# Altium footprint library EDR.PcbLib: 85 footprints (part 5 of 6)
Each footprint in its own frame and in the unit in brackets; x right, y up, seen from the top. Pads: shape width x height; smd on the part's side, far side on the other; paste and mask are expansions set on the pad; w line width, h text height; cw(c..) or ccw(c..) is an arc to the next point about the centre after c.
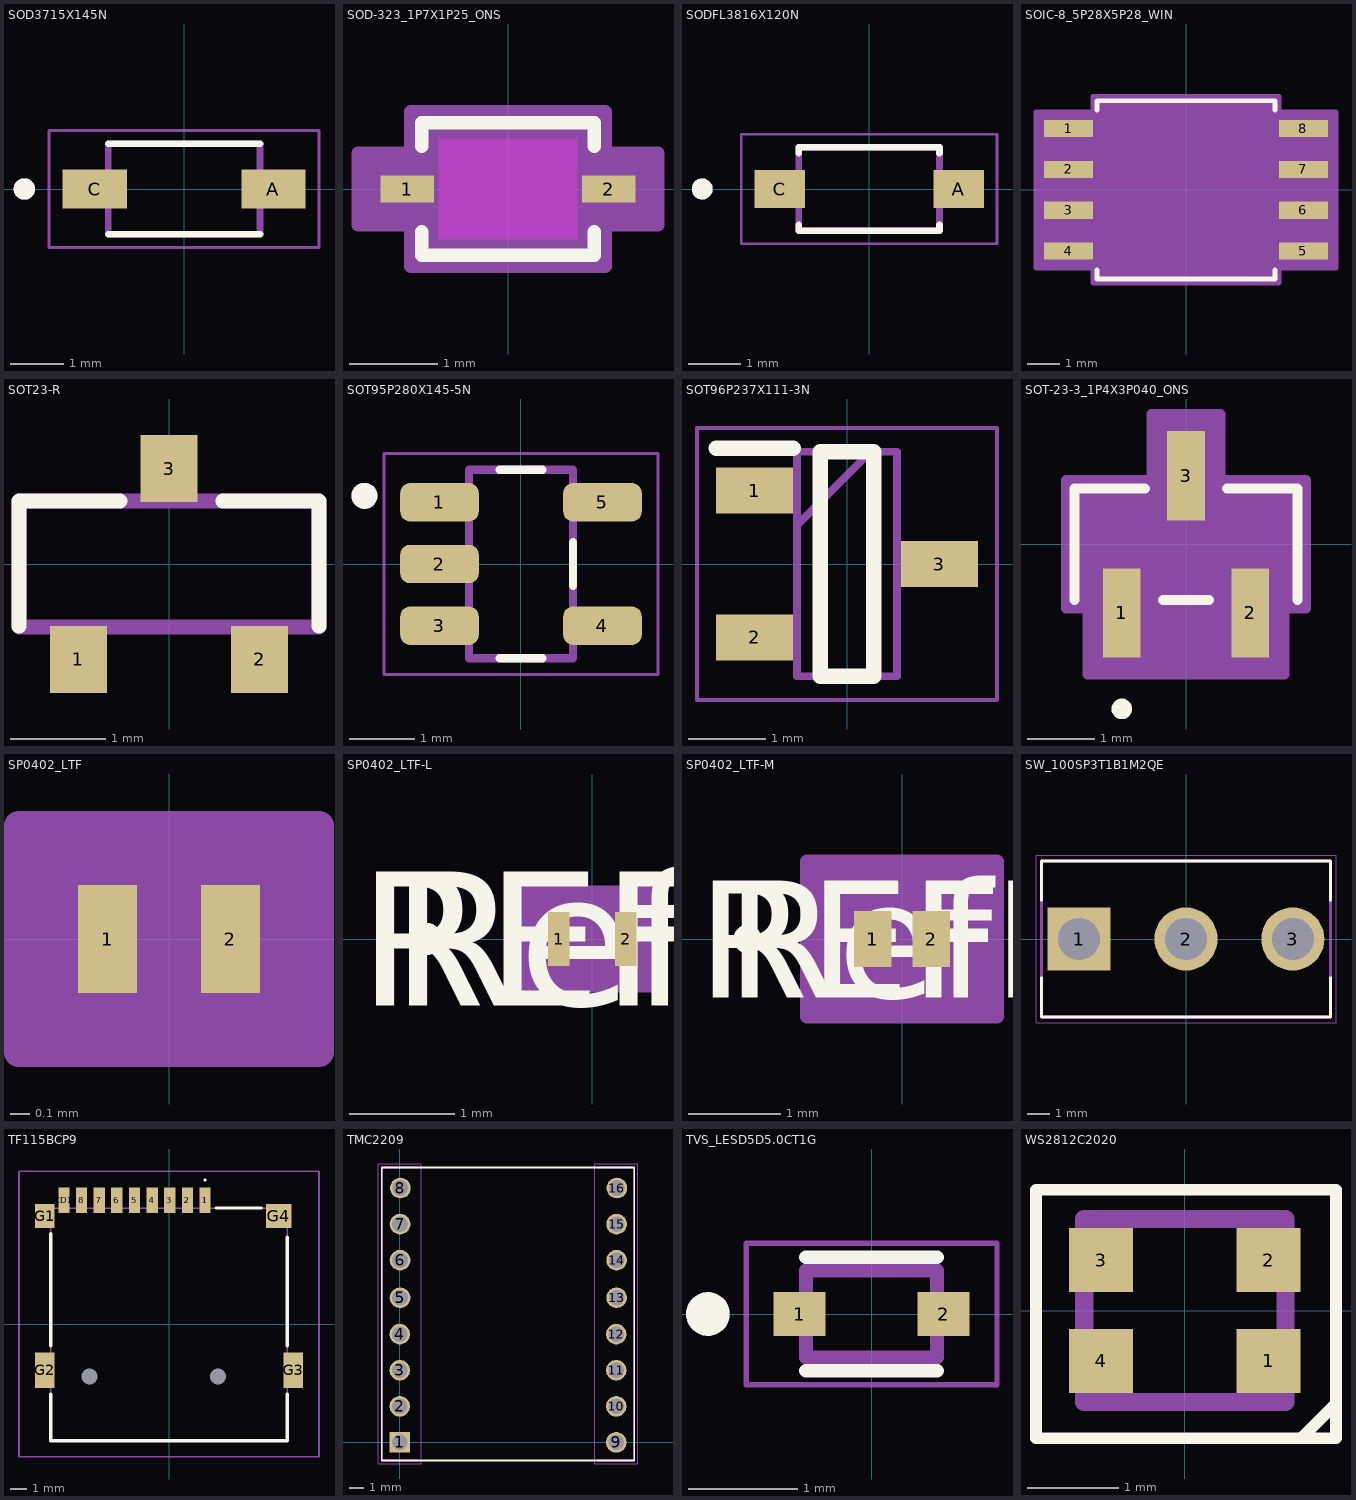
[diagram p4: the footprints below, top view; thin cyan lines are the x and y axes]

## SOD3715X145N [mm]
pads (2):
  rect 1.21x0.73 smd: A(1.68,0) C(-1.68,0)
Top Overlay:
  circle w0.2: c-3,0 r0.1
  lines w0.127: -1.425,-0.85 1.425,-0.85 ; -1.425,0.85 1.425,0.85
Top 3D Body:
  circle w0.2: c-3,0 r0.1
  lines w0.127: -1.425,-0.85 -1.425,0.85 1.425,0.85 1.425,-0.85 -1.425,-0.85
Top Courtyard:
  lines w0.05: -2.535,-1.1 -2.535,1.1 2.535,1.1 2.535,-1.1 -2.535,-1.1
3D body "step_temp.STEP": height 0.8, standoff -0.73, extent -1.825,-0.775 1.825,0.775

## SOD-323_1P7X1P25_ONS [mil]
pads (2):
  rect 24x12 smd paste+0 mask+0: 1(-45,0) 2(45,0)
Top Layer keep-out:
  region: -31,-22.5 -31,22.5 31,22.5 31,-22.5
Top Overlay:
  lines w6: -38.5,-19.1 -38.5,-29.5 38.5,-29.5 38.5,-19.1 ; -38.5,19.1 -38.5,29.5 38.5,29.5 38.5,19.1
Keep-Out Layer:
  region: -31,-22.5 -31,22.5 31,22.5 31,-22.5
Top 3D Body:
  lines w1: -33.5,-12.25 -21.25,-24.5 ; -33.5,12.25 -21.25,24.5 ; -49,-6 -49,6 -33.5,6 -33.5,-6 -49,-6 ; -33.5,-24.5 33.5,-24.5 33.5,24.5 -33.5,24.5 -33.5,-24.5 ; 33.5,-6 33.5,6 49,6 49,-6 33.5,-6
  text "*" at -36,-25 h50
Top Courtyard:
  region: -43.5,-16 -67,-16 -67,16 -43.5,16 -43.5,34.5 43.5,34.5 43.5,16 67,16 67,-16 43.5,-16 43.5,-34.5 -43.5,-34.5
  lines w6: -67,-16 -67,16 -43.5,16 -43.5,34.5 43.5,34.5 43.5,16 67,16 67,-16 43.5,-16 43.5,-34.5 -43.5,-34.5 -43.5,-16 -67,-16
3D body "SOD-323_1P7X1P25_ONS.step": height 18.27, standoff 0, extent -49.02,-24.49 49.02,24.49

## SODFL3816X120N [mm]
height 1.2
pads (2):
  rect 0.97x0.73 smd paste+0 mask+0.102: A(1.72,0) C(-1.72,0)
Top Overlay:
  circle w0.2: c-3.205,0 r0.1
  lines w0.127: -1.35,-0.685 -1.35,-0.8 1.35,-0.8 1.35,-0.685 ; -1.35,0.685 -1.35,0.8 1.35,0.8 1.35,0.685
Top 3D Body:
  circle w0.2: c-3.205,0 r0.1
  lines w0.127: -1.35,-0.8 1.35,-0.8 1.35,0.8 -1.35,0.8 -1.35,-0.8
Top Courtyard:
  lines w0.05: -2.455,-1.05 2.455,-1.05 2.455,1.05 -2.455,1.05 -2.455,-1.05
3D body "step_temp.STEP": height 1.1, standoff 0.1, extent -1.9,-0.762 1.9,0.838

## SOIC-8_5P28X5P28_WIN [mil]
pads (8):
  rect 60x21 smd paste+0 mask+0: 1(-143.5,75) 2(-143.5,25) 3(-143.5,-25) 4(-143.5,-75) 5(143.5,-75) 6(143.5,-25) 7(143.5,25) 8(143.5,75)
Top Overlay:
  lines w6: -109,-97.8 -109,-109 109,-109 109,-97.8 ; -109,97.8 -109,109 109,109 109,97.8
Top 3D Body:
  lines w1: -12,104 ccw(c0,104) 12,104 ; -159.5,-84.5 -104,-84.5 -104,-65.5 -159.5,-65.5 -159.5,-84.5 ; -159.5,-34.5 -104,-34.5 -104,-15.5 -159.5,-15.5 -159.5,-34.5 ; -159.5,15.5 -104,15.5 -104,34.5 -159.5,34.5 -159.5,15.5 ; -159.5,65.5 -104,65.5 -104,84.5 -159.5,84.5 -159.5,65.5 ; -104,-104 -104,104 104,104 104,-104 -104,-104 ; 104,-84.5 159.5,-84.5 159.5,-65.5 104,-65.5 104,-84.5 ; 104,-34.5 159.5,-34.5 159.5,-15.5 104,-15.5 104,-34.5 ; 104,15.5 159.5,15.5 159.5,34.5 104,34.5 104,15.5 ; 104,65.5 159.5,65.5 159.5,84.5 104,84.5 104,65.5
  text "*" at -101.5,51 h50
Top Courtyard:
  region: -114,-95.5 -183.5,-95.5 -183.5,95.5 -114,95.5 -114,114 114,114 114,95.5 183.5,95.5 183.5,-95.5 114,-95.5 114,-114 -114,-114
  lines w6: -183.5,-95.5 -114,-95.5 -114,-114 114,-114 114,-95.5 183.5,-95.5 183.5,95.5 114,95.5 114,114 -114,114 -114,95.5 -183.5,95.5 -183.5,-95.5
3D body "SOIC-8_5P28X5P28_WIN.step": height 85.12, standoff 0, extent -159.49,-104.02 159.49,104.02

## SOT23-R [mm]
pads (3):
  rect 0.6x0.7 smd paste+0 mask+0.102: 1(-0.95,-1) 2(0.95,-1) 3(0,1)
Top Overlay:
  lines w0.152: -1.572,-0.652 -1.572,0.66 -0.514,0.66 ; 0.564,0.66 1.572,0.66 1.572,-0.652
Top 3D Body:
  region: -0.711,-1.297 -1.17,-1.297 -1.17,-0.711 -0.711,-0.711
  region: 1.168,-1.296 0.711,-1.296 0.711,-0.711 1.168,-0.711
  region: 0.229,0.711 -0.229,0.711 -0.229,1.295 0.229,1.295
  lines w0.152: -1.572,-0.66 -1.572,0.66 1.572,0.66 1.572,-0.66 -1.572,-0.66
3D body "step_temp.STEP": height 1.2, standoff -0.1, extent -1.516,-1.3 1.524,1.3

## SOT95P280X145-5N [mm]
pads (5):
  rrect50% 1.21x0.59 smd: 1(-1.255,0.95) 2(-1.255,0) 3(-1.255,-0.95) 4(1.255,-0.95) 5(1.255,0.95)
Top Overlay:
  circle w0.2: c-2.41,1.05 r0.1
  lines w0.127: -0.33,-1.45 0.33,-1.45 ; -0.33,1.45 0.33,1.45 ; 0.8,-0.335 0.8,0.335
Top 3D Body:
  circle w0.2: c-2.41,1.05 r0.1
  lines w0.127: -0.8,-1.45 0.8,-1.45 0.8,1.45 -0.8,1.45 -0.8,-1.45
Top Courtyard:
  lines w0.05: -2.11,-1.7 -2.11,1.7 2.11,1.7 2.11,-1.7 -2.11,-1.7
3D body "step_temp.STEP": height 1.45, standoff 0, extent -1.4,-1.45 1.4,1.45

## SOT96P237X111-3N [mm]
pads (3):
  rect 1x0.6 smd: 1(-1.2,0.955) 2(-1.2,-0.955) 3(1.2,0)
Top Overlay:
  lines w0.2: -1.7,1.505 -0.7,1.505 ; -0.35,-1.46 -0.35,1.46 0.35,1.46 0.35,-1.46 -0.35,-1.46
Top Courtyard:
  lines w0.1: -0.65,0.505 0.305,1.46 ; -0.65,-1.46 -0.65,1.46 0.65,1.46 0.65,-1.46 -0.65,-1.46
Bottom Assembly:
  lines w0.05: -1.95,-1.77 -1.95,1.77 1.95,1.77 1.95,-1.77 -1.95,-1.77

## SOT-23-3_1P4X3P040_ONS [mil]
pads (3):
  rect 22x52 smd paste+0 mask+0: 1(-37.5,-40) 2(37.5,-40) 3(0,40)
Top Overlay:
  circle w6: c-37.5,-96 r3
  lines w6: -65,-32.5 -65,32.5 -24.1,32.5 ; -13.4,-32.5 13.4,-32.5 ; 24.1,32.5 65,32.5 65,-32.5
Top 3D Body:
  circle w0: c-37.5,-17.5 r3
  lines w1: -60,-27.5 60,-27.5 60,27.5 -60,27.5 -60,-27.5 ; -47.5,-52 -47.5,-27.5 -27.5,-27.5 -27.5,-52 -47.5,-52 ; -10,27.5 10,27.5 10,52 -10,52 -10,27.5 ; 27.5,-52 27.5,-27.5 47.5,-27.5 47.5,-52 27.5,-52
Top Courtyard:
  region: -70,-37.5 -70,37.5 -20,37.5 -20,76 20,76 20,37.5 70,37.5 70,-37.5 57.5,-37.5 57.5,-76 -57.5,-76 -57.5,-37.5
  lines w6: -70,-37.5 -70,37.5 -20,37.5 -20,76 20,76 20,37.5 70,37.5 70,-37.5 57.5,-37.5 57.5,-76 -57.5,-76 -57.5,-37.5 -70,-37.5
3D body "SOT-23-3_1P4X3P040_ONS.step": height 44.09, standoff 0, extent -60,-52.01 60,52.01

## SP0402_LTF [mil]
pads (2):
  rect 12x22 smd paste+0 mask-1: 1(-12.5,0) 2(12.5,0)
Top 3D Body:
  lines w1: -20.5,-13 -20.5,13 20.5,13 20.5,-13 -20.5,-13
Top Courtyard:
  region: -30.5,-21 -30.5,21 -30.5,23 30.5,23 30.5,21 30.5,-21 30.5,-23 -30.5,-23
  lines w6: -30.5,-23 30.5,-23 30.5,-21 30.5,21 30.5,23 -30.5,23 -30.5,21 -30.5,-21 -30.5,-23
3D body "SP0402_LTF.step": height 22.09, standoff 0, extent -20.51,-12.99 20.51,12.99

## SP0402_LTF-L [mil]
pads (2):
  rect 8x20 smd paste+0 mask+0: 1(-12.5,0) 2(12.5,0)
Top Overlay:
  circle w6: c-62,0 r3
  text "RefDes" at -75,-25 h50
  text "REFDES" at -87.5,-25 h50
Top 3D Body:
  circle w0: c0,0 r3
  lines w1: -20.5,-13 -20.5,13 20.5,13 20.5,-13 -20.5,-13
  text "RefDes2" at -87.5,-25 h50
Top Courtyard:
  region: -24.5,-14 -24.5,14 -24.5,17 24.5,17 24.5,14 24.5,-14 24.5,-17 -24.5,-17
  lines w6: -24.5,-17 24.5,-17 24.5,-14 24.5,14 24.5,17 -24.5,17 -24.5,14 -24.5,-14 -24.5,-17
3D body "SP0402_LTF.step": height 22.09, standoff 0, extent -20.51,-12.99 20.51,12.99

## SP0402_LTF-M [mil]
pads (2):
  rect 16x24 smd paste+0 mask+0: 1(-12.5,0) 2(12.5,0)
Top Overlay:
  circle w6: c-66,0 r3
  text "REFDES" at -87.5,-25 h50
  text "RefDes" at -75,-25 h50
Top 3D Body:
  circle w0: c0,0 r3
  lines w1: -20.5,-13 20.5,-13 20.5,13 -20.5,13 -20.5,-13
  text "RefDes2" at -87.5,-25 h50
Top Courtyard:
  region: -40.5,-32 -40.5,32 -40.5,33 40.5,33 40.5,32 40.5,-32 40.5,-33 -40.5,-33
  lines w6: -40.5,-33 -40.5,-32 -40.5,32 -40.5,33 40.5,33 40.5,32 40.5,-32 40.5,-33 -40.5,-33
3D body "SP0402_LTF.step": height 22.09, standoff 0, extent -20.51,-12.99 20.51,12.99

## SW_100SP3T1B1M2QE [mm]
height 29.69
pads (3):
  rect 2.775x2.775 / inner round 2.775 / far side rect 2.775x2.775 hole 1.85 mask+0.102: 1(-4.7,0)
  round 2.775 hole 1.85 mask+0.102: 2(0,0) 3(4.7,0)
Top Overlay:
  lines w0.127: -6.35,-1.707 -6.35,-3.43 6.35,-3.43 6.35,-1.707 ; -6.35,1.707 -6.35,3.43 6.35,3.43 6.35,1.707
Top 3D Body:
  lines w0.127: -6.35,-3.43 -6.35,3.43 6.35,3.43 6.35,-3.43 -6.35,-3.43
Top Courtyard:
  lines w0.05: -6.6,-3.68 6.6,-3.68 6.6,3.68 -6.6,3.68 -6.6,-3.68
3D body "step_temp.STEP": height 26.26, standoff -8.26, extent -6.35,-3.43 6.35,3.43

## TF115BCP9 [mm]
pads (15):
  rect 0.7x1.6 smd: 1(2.25,7.75) 2(1.15,7.75) 3(0.05,7.75) 4(-1.05,7.75) 5(-2.15,7.75) 6(-3.25,7.75) 7(-4.35,7.75) 8(-5.45,7.75)
  rect 0.7x1.6 smd mask+0.08: CD1(-6.55,7.75)
  rect 1.2x1.5 smd mask+0.05: G1(-7.75,6.75)
  rect 1.2x2.2 smd: G2(-7.75,-2.85) G3(7.75,-2.85)
  rect 1.6x1.5 smd: G4(6.85,6.75)
  round 0.5 hole 1 unplated: MH1(3.05,-3.25) MH2(-4.95,-3.25)
Top Overlay:
  lines w0.1: 2.25,8.95 ccw(c2.25,9) 2.25,9.05 ccw(c2.25,9) 2.25,8.95
  lines w0.2: -7.375,-4.35 -7.375,-7.25 7.375,-7.25 7.375,-4.35 ; -7.375,-1.35 -7.375,5.65 ; 2.95,7.25 5.75,7.25 ; 7.375,-1.35 7.375,5.45
Top Courtyard:
  lines w0.1: -7.375,-7.25 -7.375,7.25 7.375,7.25 7.375,-7.25 -7.375,-7.25
Bottom Assembly:
  lines w0.1: -9.35,-8.25 -9.35,9.55 9.35,9.55 9.35,-8.25 -9.35,-8.25

## TMC2209 [mm]
pads (16):
  rect 1.45x1.45 / inner round 1.45 / far side rect 1.45x1.45 hole 1.1: 1(0,0)
  round 1.45 hole 1.1: 2(0,2.54) 3(0,5.08) 4(0,7.62) 5(0.021,10.181) 6(0.021,12.823) 7(0.021,15.363) 8(0.047,17.903) 9(15.24,0) 10(15.24,2.54) 11(15.24,5.08) 12(15.24,7.62) 13(15.261,10.181) 14(15.261,12.823) 15(15.261,15.363) 16(15.287,17.903)
Top Overlay:
  lines w0.127: -1.27,-1.27 -1.27,19.34 -0.635,19.34 0.639,19.34 1.27,19.34 13.97,19.34 14.605,19.34 15.879,19.34 16.51,19.34 16.51,-1.27 13.97,-1.27 1.27,-1.27 -1.27,-1.27
Top 3D Body:
  lines w0.127: 1.27,-1.27 -1.27,-1.27 -1.27,19.34 1.27,19.34 ; 13.97,-1.27 16.51,-1.27 16.51,19.34 13.97,19.34
Top Courtyard:
  lines w0.05: -1.52,-1.52 -1.52,19.594 1.52,19.594 1.52,-1.52 -1.52,-1.52 ; 13.72,-1.52 16.76,-1.52 16.76,19.594 13.72,19.594 13.72,-1.52

## TVS_LESD5D5.0CT1G [mm]
height 0.7
pads (2):
  rect 0.48x0.4 smd: 1(-0.66,0) 2(0.66,0)
Top Overlay:
  circle w0.2: c-1.5,0 r0.1
  lines w0.127: -0.6,-0.52 0.6,-0.52 ; -0.6,0.52 0.6,0.52
Top 3D Body:
  circle w0.2: c-1.5,0 r0.1
  lines w0.127: -0.6,-0.4 -0.6,0.4 0.6,0.4 0.6,-0.4 -0.6,-0.4
Top Courtyard:
  lines w0.05: -1.15,-0.65 1.15,-0.65 1.15,0.65 -1.15,0.65 -1.15,-0.65
3D body "step_temp.STEP": height 0.7, standoff 0, extent -0.8,-0.4 0.8,0.4

## WS2812C2020 [mm]
pads (4):
  rect 0.7x0.7 smd: 1(0.915,-0.55) 2(0.915,0.55) 3(-0.915,0.55) 4(-0.915,-0.55)
Top Overlay:
  lines w0.127: 1.283,-1.384 1.626,-1.041 ; -1.626,-1.397 -1.626,1.321 1.651,1.321 1.651,-1.397 -1.626,-1.397
Top Courtyard:
  lines w0.2: -1.1,-1 -1.1,1 1.1,1 1.1,-1 -1.1,-1
3D body "WS2812C-2020--3DModel-STEP-269445.STEP": height 0.84, standoff 0, extent -1.1,-1 1.1,1